# Altium footprint library Zmod.PcbLib: 229 footprints (part 6 of 15)
Each footprint in its own frame and in the unit in brackets; x right, y up, seen from the top. Pads: shape width x height; smd on the part's side, far side on the other; paste and mask are expansions set on the pad; w line width, h text height; cw(c..) or ccw(c..) is an arc to the next point about the centre after c.
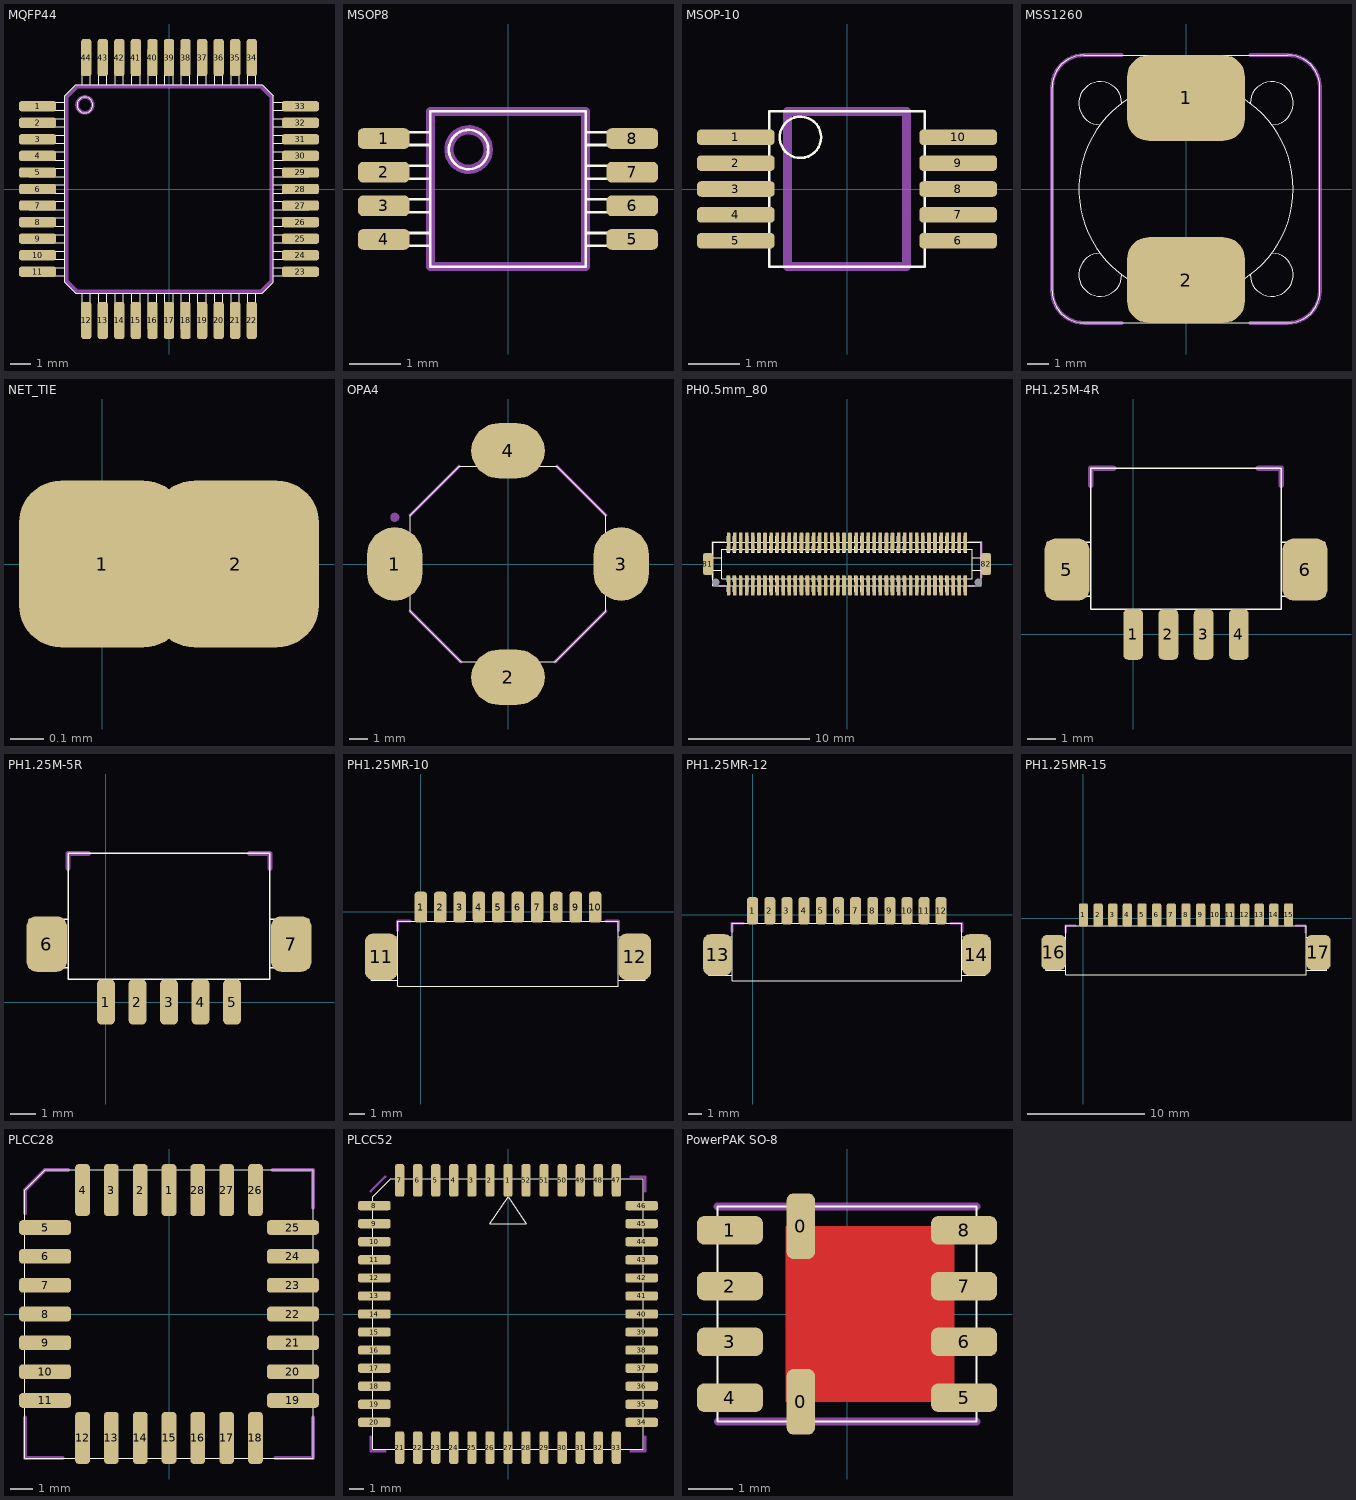
[diagram p5: the footprints below, top view; thin cyan lines are the x and y axes]

## MQFP44 [mm]
height 2.286
pads (44):
  rrect50% 1.8x0.5 smd paste+0: 1(-6.35,4) 2(-6.35,3.2) 3(-6.35,2.4) 4(-6.35,1.6) 5(-6.35,0.8) 6(-6.35,0) 7(-6.35,-0.8) 8(-6.35,-1.6) 9(-6.35,-2.4) 10(-6.35,-3.2) 11(-6.35,-4) 23(6.35,-4) 24(6.35,-3.2) 25(6.35,-2.4) 26(6.35,-1.6) 27(6.35,-0.8) 28(6.35,0) 29(6.35,0.8) 30(6.35,1.6) 31(6.35,2.4) 32(6.35,3.2) 33(6.35,4)
  rrect50% 0.5x1.8 smd paste+0: 12(-4,-6.35) 13(-3.2,-6.35) 14(-2.4,-6.35) 15(-1.6,-6.35) 16(-0.8,-6.35) 17(0,-6.35) 18(0.8,-6.35) 19(1.6,-6.35) 20(2.4,-6.35) 21(3.2,-6.35) 22(4,-6.35) 34(4,6.35) 35(3.2,6.35) 36(2.4,6.35) 37(1.6,6.35) 38(0.8,6.35) 39(0,6.35) 40(-0.8,6.35) 41(-1.6,6.35) 42(-2.4,6.35) 43(-3.2,6.35) 44(-4,6.35)
Top Overlay:
  lines w0.05: -5.05,-4.2 -6.75,-4.2 -6.75,-3.8 -5.05,-3.8 ; -5.05,-3.4 -6.75,-3.4 -6.75,-3 -5.05,-3 ; -5.05,-2.6 -6.75,-2.6 -6.75,-2.2 -5.05,-2.2 ; -5.05,-1.8 -6.75,-1.8 -6.75,-1.4 -5.05,-1.4 ; -5.05,-1 -6.75,-1 -6.75,-0.6 -5.05,-0.6 ; -5.05,-0.2 -6.75,-0.2 -6.75,0.2 -5.05,0.2 ; -5.05,0.6 -6.75,0.6 -6.75,1 -5.05,1 ; -5.05,1.4 -6.75,1.4 -6.75,1.8 -5.05,1.8 ; -5.05,2.2 -6.75,2.2 -6.75,2.6 -5.05,2.6 ; -5.05,3 -6.75,3 -6.75,3.4 -5.05,3.4 ; -5.05,3.8 -6.75,3.8 -6.75,4.2 -5.05,4.2 ; -4.2,-5.05 -4.2,-6.75 -3.8,-6.75 -3.8,-5.05 ; -4.2,5.05 -4.2,6.75 -3.8,6.75 -3.8,5.05 ; -3.4,-5.05 -3.4,-6.75 -3,-6.75 -3,-5.05 ; -3.4,5.05 -3.4,6.75 -3,6.75 -3,5.05 ; -2.6,-5.05 -2.6,-6.75 -2.2,-6.75 -2.2,-5.05 ; -2.6,5.05 -2.6,6.75 -2.2,6.75 -2.2,5.05 ; -1.8,-5.05 -1.8,-6.75 -1.4,-6.75 -1.4,-5.05 ; -1.8,5.05 -1.8,6.75 -1.4,6.75 -1.4,5.05 ; -1,-5.05 -1,-6.75 -0.6,-6.75 -0.6,-5.05 ; -1,5.05 -1,6.75 -0.6,6.75 -0.6,5.05 ; -0.2,-5.05 -0.2,-6.75 0.2,-6.75 0.2,-5.05 ; -0.2,5.05 -0.2,6.75 0.2,6.75 0.2,5.05 ; 0.6,-5.05 0.6,-6.75 1,-6.75 1,-5.05 ; 0.6,5.05 0.6,6.75 1,6.75 1,5.05 ; 1.4,-5.05 1.4,-6.75 1.8,-6.75 1.8,-5.05 ; 1.4,5.05 1.4,6.75 1.8,6.75 1.8,5.05 ; 2.2,-5.05 2.2,-6.75 2.6,-6.75 2.6,-5.05 ; 2.2,5.05 2.2,6.75 2.6,6.75 2.6,5.05 ; 3,-5.05 3,-6.75 3.4,-6.75 3.4,-5.05 ; 3,5.05 3,6.75 3.4,6.75 3.4,5.05 ; 3.8,-5.05 3.8,-6.75 4.2,-6.75 4.2,-5.05 ; 3.8,5.05 3.8,6.75 4.2,6.75 4.2,5.05 ; 5.05,-4.2 6.75,-4.2 6.75,-3.8 5.05,-3.8 ; 5.05,-3.4 6.75,-3.4 6.75,-3 5.05,-3 ; 5.05,-2.6 6.75,-2.6 6.75,-2.2 5.05,-2.2 ; 5.05,-1.8 6.75,-1.8 6.75,-1.4 5.05,-1.4 ; 5.05,-1 6.75,-1 6.75,-0.6 5.05,-0.6 ; 5.05,-0.2 6.75,-0.2 6.75,0.2 5.05,0.2 ; 5.05,0.6 6.75,0.6 6.75,1 5.05,1 ; 5.05,1.4 6.75,1.4 6.75,1.8 5.05,1.8 ; 5.05,2.2 6.75,2.2 6.75,2.6 5.05,2.6 ; 5.05,3 6.75,3 6.75,3.4 5.05,3.4 ; 5.05,3.8 6.75,3.8 6.75,4.2 5.05,4.2 ; -5.05,-4.5 -4.5,-5.05 4.5,-5.05 5.05,-4.5 5.05,4.5 4.5,5.05 -4.5,5.05 -5.05,4.5 -5.05,-4.5 ; -4.445,4.064 cw(c-4.064,4.064) -3.683,4.064 cw(c-4.064,4.064) -4.445,4.064
Mechanical 15:
  lines w0.18: -4.953,-4.445 -4.445,-4.953 4.445,-4.953 4.953,-4.445 4.953,4.445 4.445,4.953 -4.445,4.953 -4.953,4.445 -4.953,-4.445 ; -4.445,4.064 cw(c-4.064,4.064) -3.683,4.064 cw(c-4.064,4.064) -4.445,4.064
  text ".Designator" at -4.445,2.794 h1.5

## MSOP8 [mm]
height 1.1
pads (8):
  rrect50% 1x0.4 smd paste+0: 1(-2.4,0.975) 2(-2.4,0.325) 3(-2.4,-0.325) 4(-2.4,-0.975) 5(2.4,-0.975) 6(2.4,-0.325) 7(2.4,0.325) 8(2.4,0.975)
Top Overlay:
  circle w0.05: c-0.762,0.762 r0.381
  lines w0.05: -1.5,-1.1 -2.45,-1.1 -2.45,-0.85 -1.5,-0.85 ; -1.5,-0.45 -2.45,-0.45 -2.45,-0.2 -1.5,-0.2 ; -1.5,0.2 -2.45,0.2 -2.45,0.45 -1.5,0.45 ; -1.5,0.85 -2.45,0.85 -2.45,1.1 -1.5,1.1 ; 1.5,-1.1 2.45,-1.1 2.45,-0.85 1.5,-0.85 ; 1.5,-0.45 2.45,-0.45 2.45,-0.2 1.5,-0.2 ; 1.5,0.2 2.45,0.2 2.45,0.45 1.5,0.45 ; 1.5,0.85 2.45,0.85 2.45,1.1 1.5,1.1 ; -1.5,-1.5 1.5,-1.5 1.5,1.5 -1.5,1.5 -1.5,-1.5
Mechanical 15:
  circle w0.18: c-0.762,0.762 r0.381
  lines w0.18: -1.5,-1.5 1.5,-1.5 1.5,1.5 -1.5,1.5 -1.5,-1.5
  text ".Designator" at -0.508,-1.397 h1.5

## MSOP-10 [mm]
height 1.143
pads (10):
  rrect50% 1.5x0.3 smd: 1(-2.15,1) 2(-2.15,0.5) 3(-2.15,0) 4(-2.15,-0.5) 5(-2.15,-1) 6(2.15,-1) 7(2.15,-0.5) 8(2.15,0) 9(2.15,0.5) 10(2.15,1)
Top Overlay:
  circle w0.05: c-0.9,1 r0.4
  lines w0.05: -1.5,-1.05 -2.45,-1.05 -2.45,-0.95 -1.5,-0.95 ; -1.5,-0.55 -2.45,-0.55 -2.45,-0.45 -1.5,-0.45 ; -1.5,-0.05 -2.45,-0.05 -2.45,0.05 -1.5,0.05 ; -1.5,0.45 -2.45,0.45 -2.45,0.55 -1.5,0.55 ; -1.5,0.95 -2.45,0.95 -2.45,1.05 -1.5,1.05 ; 1.5,-1.05 2.45,-1.05 2.45,-0.95 1.5,-0.95 ; 1.5,-0.55 2.45,-0.55 2.45,-0.45 1.5,-0.45 ; 1.5,-0.05 2.45,-0.05 2.45,0.05 1.5,0.05 ; 1.5,0.45 2.45,0.45 2.45,0.55 1.5,0.55 ; 1.5,0.95 2.45,0.95 2.45,1.05 1.5,1.05 ; -1.5,-1.5 -1.5,1.5 1.5,1.5 1.5,-1.5 -1.5,-1.5
Mechanical 15:
  lines w0.18: -1.15,-1.5 -1.15,1.5 1.15,1.5 1.15,-1.5 -1.15,-1.5
  text ".Designator" at 0.15,-1.3 h1.5

## MSS1260 [mm] "Coilcraft MSS1260 Series"
height 6
pads (2):
  rrect50% 5.5x4 smd: 1(0,4.25) 2(0,-4.25)
Top Overlay:
  circle w0.05: c0,0 r5
  lines w0.05: -4,-3 ccw(c-4,-4) -3,-4 ; -4,3 cw(c-4,4) -3,4 ; 3,-4 ccw(c4,-4) 4,-3 ; 3,4 cw(c4,4) 4,3 ; -6.25,-4.75 ccw(c-4.75,-4.75) -4.75,-6.25 4.75,-6.25 ccw(c4.75,-4.75) 6.25,-4.75 6.25,4.75 ccw(c4.75,4.75) 4.75,6.25 -4.75,6.25 ccw(c-4.75,4.75) -6.25,4.75 -6.25,-4.75
Mechanical 15:
  lines w0.18: -3,-6.25 -4.75,-6.25 cw(c-4.75,-4.75) -6.25,-4.75 -6.25,4.75 cw(c-4.75,4.75) -4.75,6.25 -3,6.25 ; 3,-6.25 4.75,-6.25 ccw(c4.75,-4.75) 6.25,-4.75 6.25,4.75 ccw(c4.75,4.75) 4.75,6.25 3,6.25
  text ".Designator" at -5.715,1.016 h1.5

## NET_TIE [mm] "Intended copper short between nets."
pads (2):
  rrect50% 0.5x0.5 smd: 1(0,0) 2(0.4,0)
Mechanical 15:
  text ".Designator" at 0.1,0.4 h1.5

## OPA4 [mm] "SM Inductor/Transformer; 4 Leads; Body 11.43 x 11.43 x 6.35 mm (LxWxH)"
height 6.35
pads (4):
  oval 3.05x4.06 smd: 1(-6.25,0) 3(6.25,0)
  oval 4.06x3.05 smd: 2(0,-6.25) 4(0,6.25)
Top Overlay:
  lines w0.05: -5.4,-2.6 -2.6,-5.4 ; -5.4,2.7 -2.7,5.4 ; 2.6,-5.4 5.4,-2.6 ; 2.7,5.4 5.4,2.7
  lines w0.051: -5.4,-2.6 -5.4,2.7 ; -2.7,5.4 2.7,5.4 ; -2.6,-5.4 2.6,-5.4 ; 5.4,-2.6 5.4,2.7
Mechanical 15:
  circle w0.25: c-6.25,2.58 r0.125
  lines w0.18: -5.4,-2.6 -2.6,-5.4 ; -5.4,2.7 -2.7,5.4 ; 2.6,-5.4 5.4,-2.6 ; 2.7,5.4 5.4,2.7
  text ".Designator" at -4.174,1.392 h1.5

## PCBComponent_1 [mm]

## PH0.5mm_80 [mm]
height 2.2
pads (84):
  round 0.5 hole 0.6: 0(-10.8,-1.5) 0(10.8,-1.5)
  rrect50% 0.3x1.6 smd: 1(-9.75,1.8) 2(-9.25,1.8) 3(-8.75,1.8) 4(-8.25,1.8) 5(-7.75,1.8) 6(-7.25,1.8) 7(-6.75,1.8) 8(-6.25,1.8) 9(-5.75,1.8) 10(-5.25,1.8) 11(-4.75,1.8) 12(-4.25,1.8) 13(-3.75,1.8) 14(-3.25,1.8) 15(-2.75,1.8) 16(-2.25,1.8) 17(-1.75,1.8) 18(-1.25,1.8) 19(-0.75,1.8) 20(-0.25,1.8) 21(0.25,1.8) 22(0.75,1.8) 23(1.25,1.8) 24(1.75,1.8) 25(2.25,1.8) 26(2.75,1.8) 27(3.25,1.8) 28(3.75,1.8) 29(4.25,1.8) 30(4.75,1.8) 31(5.25,1.8) 32(5.75,1.8) 33(6.25,1.8) 34(6.75,1.8) 35(7.25,1.8) 36(7.75,1.8) 37(8.25,1.8) 38(8.75,1.8) 39(9.25,1.8) 40(9.75,1.8) 41(-9.75,-1.8) 42(-9.25,-1.8) 43(-8.75,-1.8) 44(-8.25,-1.8) 45(-7.75,-1.8) 46(-7.25,-1.8) 47(-6.75,-1.8) 48(-6.25,-1.8) 49(-5.75,-1.8) 50(-5.25,-1.8) 51(-4.75,-1.8) 52(-4.25,-1.8) 53(-3.75,-1.8) 54(-3.25,-1.8) 55(-2.75,-1.8) 56(-2.25,-1.8) 57(-1.75,-1.8) 58(-1.25,-1.8) 59(-0.75,-1.8) 60(-0.25,-1.8) 61(0.25,-1.8) 62(0.75,-1.8) 63(1.25,-1.8) 64(1.75,-1.8) 65(2.25,-1.8) 66(2.75,-1.8) 67(3.25,-1.8) 68(3.75,-1.8) 69(4.25,-1.8) 70(4.75,-1.8) 71(5.25,-1.8) 72(5.75,-1.8) 73(6.25,-1.8) 74(6.75,-1.8) 75(7.25,-1.8) 76(7.75,-1.8) 77(8.25,-1.8) 78(8.75,-1.8) 79(9.25,-1.8) 80(9.75,-1.8)
  rrect50% 0.8x1.8 smd: 81(-11.45,0) 82(11.45,0)
Top Overlay:
  drawing of 652 lines, arcs and shapes, not listed
Mechanical 15:
  lines w0.18: -11.05,-1.15 -11.05,1.8 -10.1,1.8 ; -10.5,-1.8 -10.05,-1.8 ; 10.05,-1.8 10.45,-1.8 ; 10.05,1.8 11.05,1.8 11.05,-1.1
  text ".Designator" at -5.05,-0.6 h1.5

## PH1.25M-4R [mm] "HRS DF13 series 1.25 mm pitch, 4 way, plug., right angle. Rev. 1"
height 3.6
pads (6):
  rrect50% 0.7x1.8 smd paste+0: 1(0,0) 2(1.25,0) 3(2.5,0) 4(3.75,0)
  rrect50% 1.6x2.2 smd: 5(-2.35,2.3) 6(6.1,2.3)
Top Overlay:
  lines w0.05: -0.2,0.9 -0.2,-0.3 0.2,-0.3 0.2,0.3 0.2,0.9 ; 1.05,0.9 1.05,-0.275 1.45,-0.275 1.45,0.325 1.45,0.9 ; 2.3,0.9 2.3,-0.3 2.7,-0.3 2.7,0.3 2.7,0.9 ; 3.55,0.9 3.55,-0.3 3.95,-0.3 3.95,0.3 3.95,0.9 ; -3.05,1.35 -1.5,1.35 -1.5,3.275 -3.05,3.275 -3.05,1.35 ; -1.5,0.9 -1.5,3.5 -1.5,5.9 5.25,5.9 5.25,0.9 -1.5,0.9 ; 5.25,1.35 5.25,3.275 6.8,3.275 6.8,1.35 5.25,1.35
Mechanical 15:
  lines w0.2: -1.5,5.3 -1.5,5.9 -0.7,5.9 ; 4.45,5.9 5.25,5.9 5.25,5.3
  text ".Designator" at -0.75,2.675 h1.5

## PH1.25M-5R [mm] "HRS DF13 series 1.25 mm pitch, 5 way, plug., right angle. Rev. 1"
height 3.6
pads (7):
  rrect50% 0.7x1.8 smd paste+0: 1(0,0) 2(1.25,0) 3(2.5,0) 4(3.75,0) 5(5,0)
  rrect50% 1.6x2.2 smd: 6(-2.35,2.3) 7(7.35,2.3)
Top Overlay:
  lines w0.05: -0.2,0.9 -0.2,-0.3 0.2,-0.3 0.2,0.3 0.2,0.9 ; 1.05,0.9 1.05,-0.275 1.45,-0.275 1.45,0.325 1.45,0.9 ; 2.3,0.9 2.3,-0.3 2.7,-0.3 2.7,0.3 2.7,0.9 ; 3.55,0.9 3.55,-0.3 3.95,-0.3 3.95,0.3 3.95,0.9 ; 4.8,0.9 4.8,-0.3 5.2,-0.3 5.2,0.3 5.2,0.9 ; -3.05,1.35 -1.5,1.35 -1.5,3.275 -3.05,3.275 -3.05,1.35 ; -1.5,0.9 -1.5,3.5 -1.5,5.9 6.5,5.9 6.5,0.9 -1.5,0.9 ; 6.5,1.35 6.5,3.275 8.05,3.275 8.05,1.35 6.5,1.35
Mechanical 15:
  lines w0.2: -1.5,5.3 -1.5,5.9 -0.7,5.9 ; 5.7,5.9 6.5,5.9 6.5,5.3
  text ".Designator" at -0.25,2.75 h1.5

## PH1.25MR-10 [mm] "Molex 53261 series 1.25 mm pitch, 10 way, plug, Rev. 1"
height 3.4
pads (12):
  rrect50% 0.8x2 smd paste+0: 1(0,0.3) 2(1.25,0.3) 3(2.5,0.3) 4(3.75,0.3) 5(5,0.3) 6(6.25,0.3) 7(7.5,0.3) 8(8.75,0.3) 9(10,0.3) 10(11.25,0.3)
  rrect50% 2.1x3 smd: 11(-2.55,-2.9) 12(13.8,-2.9)
Top Overlay:
  lines w0.05: -1.5,-4.4 -3.2,-4.4 -3.2,-1.6 -1.5,-1.6 ; -0.2,-0.6 -0.2,0 0.2,0 0.2,-0.6 ; 1.05,-0.6 1.05,0 1.45,0 1.45,-0.6 ; 2.3,-0.6 2.3,0 2.7,0 2.7,-0.6 ; 3.55,-0.6 3.55,0 3.95,0 3.95,-0.6 ; 4.8,-0.6 4.8,0 5.2,0 5.2,-0.6 ; 6.05,-0.6 6.05,0 6.45,0 6.45,-0.6 ; 7.3,-0.6 7.3,0 7.7,0 7.7,-0.6 ; 8.55,-0.6 8.55,0 8.95,0 8.95,-0.6 ; 9.8,-0.6 9.8,0 10.2,0 10.2,-0.6 ; 11.05,-0.6 11.05,0 11.45,0 11.45,-0.6 ; 12.775,-4.4 14.475,-4.4 14.475,-1.6 12.775,-1.6 ; -1.5,-4.8 -1.5,-0.6 12.75,-0.6 12.75,-4.8 -1.5,-4.8
Mechanical 15:
  lines w0.2: -1.5,-1.2 -1.5,-0.6 -0.7,-0.6 ; 11.95,-0.6 12.75,-0.6 12.75,-1.2
  text ".Designator" at -1.925,-3.325 h1.5

## PH1.25MR-12 [mm] "Molex 53261 series 1.25 mm pitch, 12 way, plug, Rev. 1"
height 3.4
pads (14):
  rrect50% 0.8x2 smd paste+0: 1(0,0.3) 2(1.25,0.3) 3(2.5,0.3) 4(3.75,0.3) 5(5,0.3) 6(6.25,0.3) 7(7.5,0.3) 8(8.75,0.3) 9(10,0.3) 10(11.25,0.3) 11(12.5,0.3) 12(13.725,0.3)
  rrect50% 2.1x3 smd: 13(-2.55,-2.9) 14(16.3,-2.9)
Top Overlay:
  lines w0.05: -1.5,-4.4 -3.2,-4.4 -3.2,-1.6 -1.5,-1.6 ; -0.2,-0.6 -0.2,0 0.2,0 0.2,-0.6 ; 1.05,-0.6 1.05,0 1.45,0 1.45,-0.6 ; 2.3,-0.6 2.3,0 2.7,0 2.7,-0.6 ; 3.55,-0.6 3.55,0 3.95,0 3.95,-0.6 ; 4.8,-0.6 4.8,0 5.2,0 5.2,-0.6 ; 6.05,-0.6 6.05,0 6.45,0 6.45,-0.6 ; 7.3,-0.6 7.3,0 7.7,0 7.7,-0.6 ; 8.55,-0.6 8.55,0 8.95,0 8.95,-0.6 ; 9.8,-0.6 9.8,0 10.2,0 10.2,-0.6 ; 11.05,-0.6 11.05,0 11.45,0 11.45,-0.6 ; 12.3,-0.6 12.3,0 12.7,0 12.7,-0.6 ; 13.55,-0.6 13.55,0 13.95,0 13.95,-0.6 ; 15.25,-4.375 16.95,-4.375 16.95,-1.575 15.25,-1.575 ; -1.5,-4.8 -1.5,-0.6 15.25,-0.6 15.25,-4.8 -1.5,-4.8
Mechanical 15:
  lines w0.2: -1.5,-1.2 -1.5,-0.6 -0.7,-0.6 ; 14.45,-0.6 15.25,-0.6 15.25,-1.2
  text ".Designator" at -0.45,-3.3 h1.5

## PH1.25MR-15 [mm] "Molex 53261 series 1.25 mm pitch, 15 way, plug, Rev. 1"
height 3.4
pads (17):
  rrect50% 0.8x2 smd paste+0: 1(0,0.3) 2(1.25,0.3) 3(2.5,0.3) 4(3.75,0.3) 5(5,0.3) 6(6.25,0.3) 7(7.5,0.3) 8(8.75,0.3) 9(10,0.3) 10(11.25,0.3) 11(12.5,0.3) 12(13.75,0.3) 13(15,0.3) 14(16.25,0.3) 15(17.5,0.3)
  rrect50% 2.1x3 smd: 16(-2.55,-2.9) 17(20.05,-2.9)
Top Overlay:
  lines w0.05: -1.5,-4.4 -3.2,-4.4 -3.2,-1.6 -1.5,-1.6 ; -0.2,-0.6 -0.2,0 0.2,0 0.2,-0.6 ; 1.05,-0.6 1.05,0 1.45,0 1.45,-0.6 ; 2.3,-0.6 2.3,0 2.7,0 2.7,-0.6 ; 3.55,-0.6 3.55,0 3.95,0 3.95,-0.6 ; 4.8,-0.6 4.8,0 5.2,0 5.2,-0.6 ; 6.05,-0.6 6.05,0 6.45,0 6.45,-0.6 ; 7.3,-0.6 7.3,0 7.7,0 7.7,-0.6 ; 8.55,-0.6 8.55,0 8.95,0 8.95,-0.6 ; 9.8,-0.6 9.8,0 10.2,0 10.2,-0.6 ; 11.05,-0.6 11.05,0 11.45,0 11.45,-0.6 ; 12.3,-0.6 12.3,0 12.7,0 12.7,-0.6 ; 13.55,-0.6 13.55,0 13.95,0 13.95,-0.6 ; 14.8,-0.6 14.8,0 15.2,0 15.2,-0.6 ; 16.05,-0.6 16.05,0 16.45,0 16.45,-0.6 ; 17.275,-0.6 17.275,0 17.675,0 17.675,-0.6 ; 19.05,-4.4 20.75,-4.4 20.75,-1.6 19.05,-1.6 ; -1.5,-4.8 19,-4.8 19,-0.6 -1.5,-0.6 -1.5,-4.8
Mechanical 15:
  lines w0.2: -1.5,-1.2 -1.5,-0.6 -0.7,-0.6 ; 18.15,-0.6 18.95,-0.6 18.95,-1.2
  text ".Designator" at 1.25,-3.75 h1.5

## PLCC28 [mm]
height 3.175
pads (28):
  rrect50% 0.65x2.3 smd paste+0: 1(0,5.461) 2(-1.27,5.461) 3(-2.54,5.461) 4(-3.81,5.461) 12(-3.81,-5.461) 13(-2.54,-5.461) 14(-1.27,-5.461) 15(0,-5.461) 16(1.27,-5.461) 17(2.54,-5.461) 18(3.81,-5.461) 26(3.81,5.461) 27(2.54,5.461) 28(1.27,5.461)
  rrect50% 2.3x0.65 smd paste+0: 5(-5.461,3.81) 6(-5.461,2.54) 7(-5.461,1.27) 8(-5.461,0) 9(-5.461,-1.27) 10(-5.461,-2.54) 11(-5.461,-3.81) 19(5.461,-3.81) 20(5.461,-2.54) 21(5.461,-1.27) 22(5.461,0) 23(5.461,1.27) 24(5.461,2.54) 25(5.461,3.81)
Top Overlay:
  lines w0.05: -6.35,-6.35 -6.35,5.461 -5.461,6.35 6.35,6.35 6.35,-6.35 -6.35,-6.35
Mechanical 15:
  lines w0.18: -6.35,-4.572 -6.35,-6.35 -4.699,-6.35 ; -6.35,4.445 -6.35,5.461 -5.461,6.35 -4.445,6.35 ; 4.572,6.35 6.35,6.35 6.35,4.699 ; 4.699,-6.35 6.35,-6.35 6.35,-4.572
  text ".Designator" at -3.937,2.921 h1.5

## PLCC52 [mm]
height 6.35
pads (52):
  rrect50% 0.65x2.3 smd paste+0: 1(0,9.398) 2(-1.27,9.398) 3(-2.54,9.398) 4(-3.81,9.398) 5(-5.08,9.398) 6(-6.35,9.398) 7(-7.62,9.398) 21(-7.62,-9.398) 22(-6.35,-9.398) 23(-5.08,-9.398) 24(-3.81,-9.398) 25(-2.54,-9.398) 26(-1.27,-9.398) 27(0,-9.398) 28(1.27,-9.398) 29(2.54,-9.398) 30(3.81,-9.398) 31(5.08,-9.398) 32(6.35,-9.398) 33(7.62,-9.398) 47(7.62,9.398) 48(6.35,9.398) 49(5.08,9.398) 50(3.81,9.398) 51(2.54,9.398) 52(1.27,9.398)
  rrect50% 2.3x0.65 smd paste+0: 8(-9.398,7.62) 9(-9.398,6.35) 10(-9.398,5.08) 11(-9.398,3.81) 12(-9.398,2.54) 13(-9.398,1.27) 14(-9.398,0) 15(-9.398,-1.27) 16(-9.398,-2.54) 17(-9.398,-3.81) 18(-9.398,-5.08) 19(-9.398,-6.35) 20(-9.398,-7.62) 34(9.398,-7.62) 35(9.398,-6.35) 36(9.398,-5.08) 37(9.398,-3.81) 38(9.398,-2.54) 39(9.398,-1.27) 40(9.398,0) 41(9.398,1.27) 42(9.398,2.54) 43(9.398,3.81) 44(9.398,5.08) 45(9.398,6.35) 46(9.398,7.62)
Top Overlay:
  lines w0.05: -9.525,-9.525 9.525,-9.525 9.525,9.525 -8.255,9.525 -9.525,8.255 -9.525,-9.525 ; -1.27,6.35 1.27,6.35 0,8.255 -1.27,6.35
Mechanical 15:
  lines w0.18: -9.652,-8.636 -9.652,-9.652 -8.636,-9.652 ; -9.652,8.636 -8.636,9.652 ; 8.636,-9.652 9.652,-9.652 9.652,-8.636 ; 8.636,9.652 9.652,9.652 9.652,8.636
  text ".Designator" at -6.096,6.35 h1.5

## PowerPAK SO-8 [mm] "Vishay PowerPAK SO-8"
height 1.2
pads (10):
  rrect50% 0.65x1.5 smd: 0(-1.05,-2) 0(-1.05,2)
  rrect50% 1.5x0.65 smd: 1(-2.667,1.905) 2(-2.667,0.635) 3(-2.667,-0.635) 4(-2.667,-1.905) 5(2.667,-1.905) 6(2.667,-0.635) 7(2.667,0.635) 8(2.667,1.905)
Top Layer:
  rectangle: -1.4,-2 2.45,2
Top Overlay:
  lines w0.05: -2.955,-0.835 -3.155,-0.835 -3.155,-0.435 -2.955,-0.435 ; -2.95,-2.105 -3.15,-2.105 -3.15,-1.705 -2.95,-1.705 ; -2.95,0.435 -3.15,0.435 -3.15,0.835 -2.95,0.835 ; -2.95,1.705 -3.15,1.705 -3.15,2.105 -2.95,2.105 ; 2.95,-2.105 3.15,-2.105 3.15,-1.705 2.95,-1.705 ; 2.95,-0.835 3.15,-0.835 3.15,-0.435 2.95,-0.435 ; 2.95,0.435 3.15,0.435 3.15,0.835 2.95,0.835 ; 2.95,1.705 3.15,1.705 3.15,2.105 2.95,2.105 ; -2.95,-2.45 2.95,-2.45 2.95,2.45 -2.95,2.45 -2.95,-2.45
Mechanical 15:
  lines w0.18: -2.95,2.45 2.95,2.45 ; -2.94,-2.45 2.95,-2.45
  text ".Designator" at -2.35,-0.4 h1.5